# Altium footprint library 封装库.PcbLib: 755 footprints (part 40 of 48)
Each footprint in its own frame and in the unit in brackets; x right, y up, seen from the top. Pads: shape width x height; smd on the part's side, far side on the other; paste and mask are expansions set on the pad; w line width, h text height; cw(c..) or ccw(c..) is an arc to the next point about the centre after c.
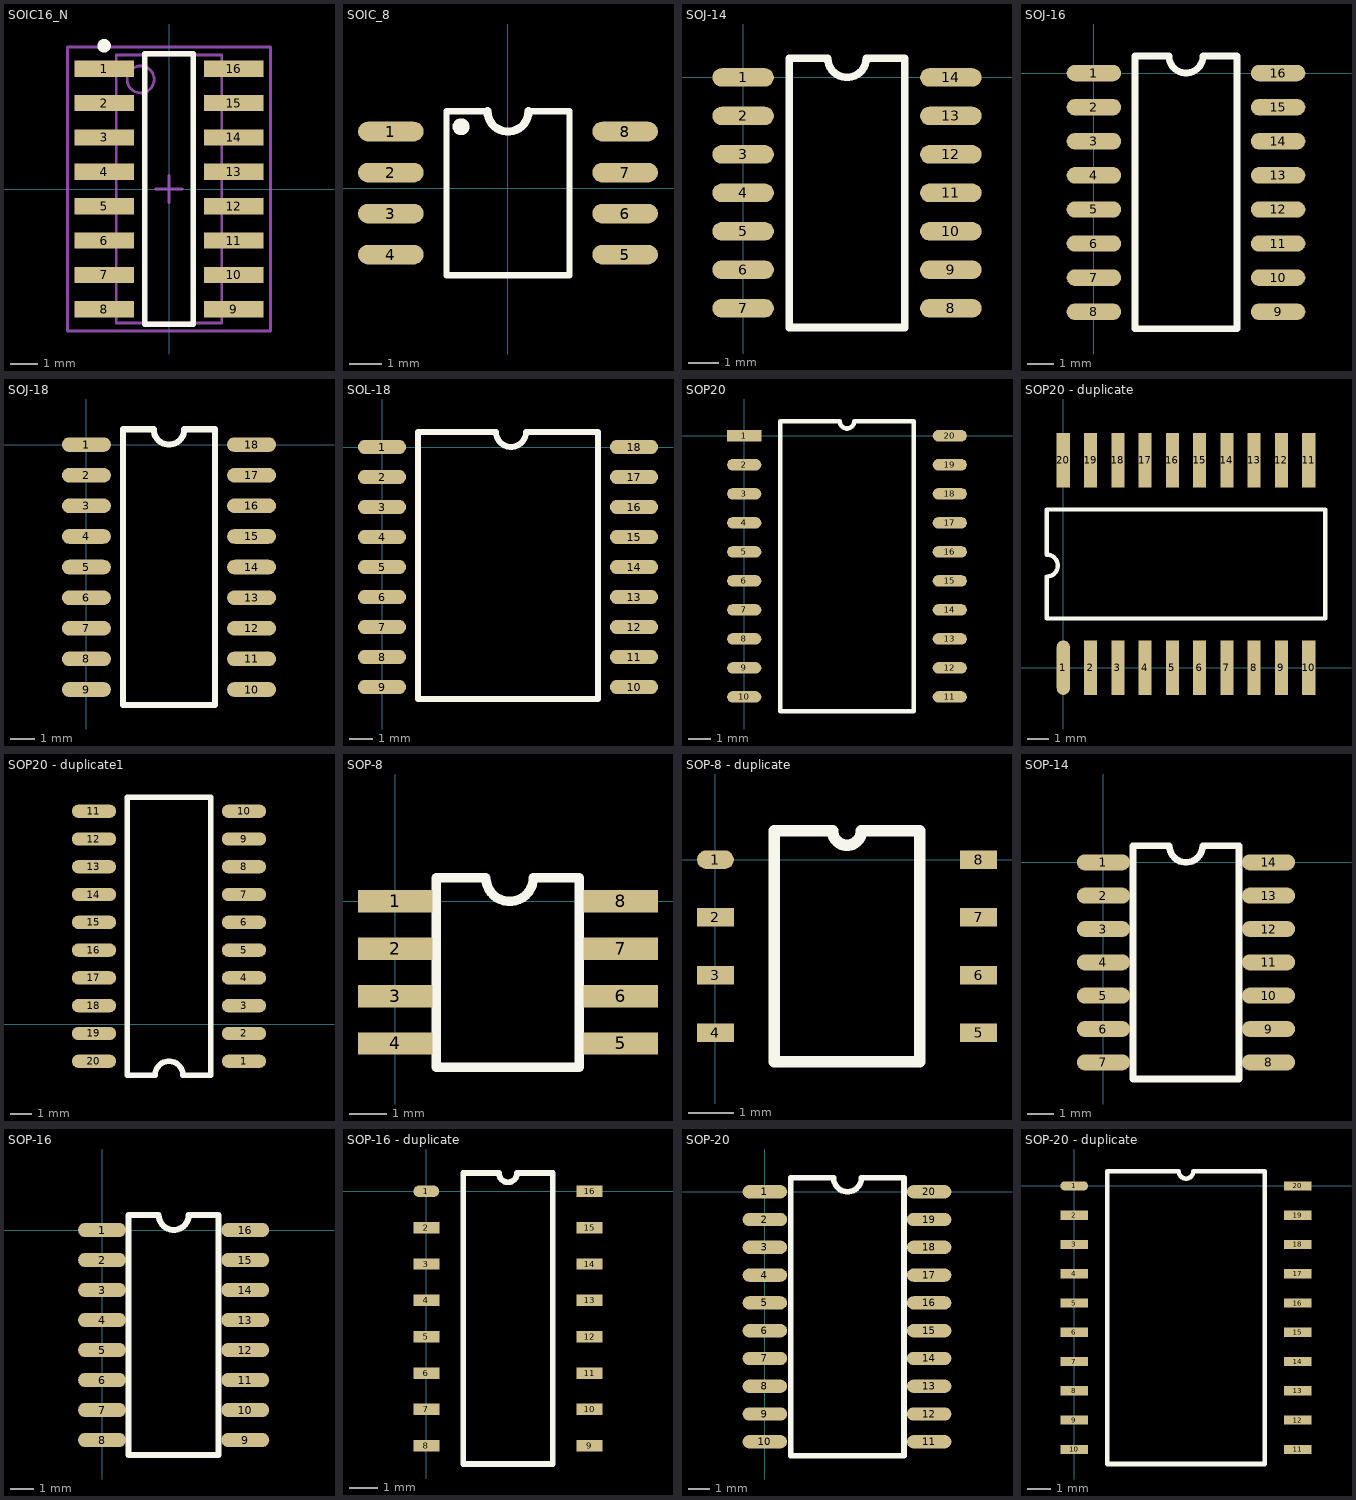
[diagram p39: the footprints below, top view; thin cyan lines are the x and y axes]

## SOIC16_N [mm] "SOIC, 16-Leads, Body 9.9x3.9mm, Pitch 1.27mm, IPC Medium Density"
height 1.91
pads (16):
  rect 2.2x0.6 smd: 1(-2.4,4.445) 2(-2.4,3.175) 3(-2.4,1.905) 4(-2.4,0.635) 5(-2.4,-0.635) 6(-2.4,-1.905) 7(-2.4,-3.175) 8(-2.4,-4.445) 9(2.4,-4.445) 10(2.4,-3.175) 11(2.4,-1.905) 12(2.4,-0.635) 13(2.4,0.635) 14(2.4,1.905) 15(2.4,3.175) 16(2.4,4.445)
Top Overlay:
  circle w0.25: c-2.4,5.295 r0.125
  lines w0.2: -0.9,-5 0.9,-5 0.9,5 -0.9,5 -0.9,-5
Mechanical 13:
  circle w0.1: c-1.05,4.05 r0.5
  lines w0.1: -1.95,-4.95 1.95,-4.95 1.95,4.95 -1.95,4.95 -1.95,-4.95
Mechanical 15:
  lines w0.1: -0.5,0 0.5,0 ; 0,-0.5 0,0.5 ; -3.75,-5.25 3.75,-5.25 3.75,5.25 -3.75,5.25 -3.75,-5.25
3D body: height 1.91, standoff 0, extent -1.95,-4.95 1.95,4.95

## SOIC_8 [mil] "DS1302"
pads (8):
  oval 80x24 smd: 1(-142.75,69) 2(-142.75,19) 3(-142.75,-31) 4(-142.75,-81) 5(143,-81) 6(143,-31) 7(143,19) 8(143,69)
Top Overlay:
  circle w10: c-57.12,74.91 r5.3
  lines w7.87: -24.87,94 -74.87,94 -74.87,-106 75.13,-106 75.13,94 25.13,94
  lines w10: -24.87,94 ccw(c0.13,94) 25.13,94

## SOJ-14 [mil]
pads (14):
  oval 80x24 smd: 1(0,0) 2(0,-50) 3(0,-100) 4(0,-150) 5(0,-200) 6(0,-250) 7(0,-300) 8(270,-300) 9(270,-250) 10(270,-200) 11(270,-150) 12(270,-100) 13(270,-50) 14(270,0)
Top Overlay:
  lines w10: 60,-325 210,-325 210,25 160,25 cw(c135,25) 110,25 60,25 60,-325

## SOJ-16 [mil]
pads (16):
  oval 80x24 smd: 1(0,0) 2(0,-50) 3(0,-100) 4(0,-150) 5(0,-200) 6(0,-250) 7(0,-300) 8(0,-350) 9(270,-350) 10(270,-300) 11(270,-250) 12(270,-200) 13(270,-150) 14(270,-100) 15(270,-50) 16(270,0)
Top Overlay:
  lines w10: 60,-375 210,-375 210,25 160,25 cw(c135,25) 110,25 60,25 60,-375

## SOJ-18 [mil]
pads (18):
  oval 80x24 smd: 1(0,0) 2(0,-50) 3(0,-100) 4(0,-150) 5(0,-200) 6(0,-250) 7(0,-300) 8(0,-350) 9(0,-400) 10(270,-400) 11(270,-350) 12(270,-300) 13(270,-250) 14(270,-200) 15(270,-150) 16(270,-100) 17(270,-50) 18(270,0)
Top Overlay:
  lines w10: 60,-425 210,-425 210,25 160,25 cw(c135,25) 110,25 60,25 60,-425

## SOL-18 [mil]
pads (18):
  oval 80x24 smd: 1(0,0) 2(0,-50) 3(0,-100) 4(0,-150) 5(0,-200) 6(0,-250) 7(0,-300) 8(0,-350) 9(0,-400) 10(420,-400) 11(420,-350) 12(420,-300) 13(420,-250) 14(420,-200) 15(420,-150) 16(420,-100) 17(420,-50) 18(420,0)
Top Overlay:
  lines w10: 60,-420 360,-420 360,25 240,25 cw(c215,25) 190,25 60,25 60,-420

## SOP20 [mm]
pads (20):
  rect 1.5x0.5 smd: 1(0,0)
  oval 1.5x0.5 smd: 2(0,-1.27) 3(0,-2.54) 4(0,-3.81) 5(0,-5.08) 6(0,-6.35) 7(0,-7.62) 8(0,-8.89) 9(0,-10.16) 10(0,-11.43) 11(9,-11.43) 12(9,-10.16) 13(9,-8.89) 14(9,-7.62) 15(9,-6.35) 16(9,-5.08) 17(9,-3.81) 18(9,-2.54) 19(9,-1.27) 20(9,0)
Top Overlay:
  lines w0.2: 1.585,-12.065 1.585,0.635 4.183,0.635 ccw(c4.5,0.635) 4.817,0.635 7.415,0.635 7.415,-12.065 1.585,-12.065

## SOP20 - duplicate [mil]
pads (20):
  oval 24x100 smd: 1(0,0)
  rect 24x100 smd: 2(50,0) 3(100,0) 4(150,0) 5(200,0) 6(250,0) 7(300,0) 8(350,0) 9(400,0) 10(450,0) 11(450,380) 12(400,380) 13(350,380) 14(300,380) 15(250,380) 16(200,380) 17(150,380) 18(100,380) 19(50,380) 20(0,380)
Top Overlay:
  lines w8: -30,90 -30,167 ccw(c-30,187) -30,207 -30,290 480,290 480,90 -30,90

## SOP20 - duplicate1 [mil]
height 509.06
pads (20):
  oval 80x24 smd: 1(527.41,-66.22) 2(527.41,-16.22) 3(527.41,33.78) 4(527.41,83.78) 5(527.41,133.78) 6(527.41,183.78) 7(527.41,233.78) 8(527.41,283.78) 9(527.41,333.78) 10(527.41,383.78) 11(257.41,383.78) 12(257.41,333.78) 13(257.41,283.78) 14(257.41,233.78) 15(257.41,183.78) 16(257.41,133.78) 17(257.41,83.78) 18(257.41,33.78) 19(257.41,-16.22) 20(257.41,-66.22)
Top Overlay:
  lines w10: 317.41,-91.22 317.41,408.78 467.41,408.78 467.41,-91.22 417.41,-91.22 ccw(c392.41,-91.22) 367.41,-91.22 317.41,-91.22

## SOP-8 [mm]
pads (8):
  rect 2x0.6 smd: 1(0,0) 2(0,-1.27) 3(0,-2.54) 4(0,-3.81) 5(6.048,-3.81) 6(6.048,-2.54) 7(6.048,-1.27) 8(6.048,0)
Top Overlay:
  lines w0.254: 1.098,-4.445 4.938,-4.445 4.938,0.635 3.703,0.635 cw(c3.068,0.635) 2.433,0.635 1.098,0.635 1.098,-4.445

## SOP-8 - duplicate [mil] "stc"
pads (8):
  oval 32x16 smd: 1(0,0)
  rect 32x16 smd: 2(0,-50) 3(0,-100) 4(0,-150) 5(228,-150) 6(228,-100) 7(228,-50) 8(228,0)
Top Overlay:
  lines w10: 51,-175 177,-175 177,25 126.5,25 cw(c114,25) 101.5,25 51,25 51,-175

## SOP-14 [mil]
pads (14):
  oval 80x24 smd: 1(0,0) 2(0,-50) 3(0,-100) 4(0,-150) 5(0,-200) 6(0,-250) 7(0,-300) 8(247.56,-300) 9(247.56,-250) 10(247.56,-200) 11(247.56,-150) 12(247.56,-100) 13(247.56,-50) 14(247.56,0)
Top Overlay:
  lines w10: 44.25,-325 203.31,-325 203.31,25 148.78,25 cw(c123.78,25) 98.78,25 44.25,25 44.25,-325

## SOP-16 [mil]
pads (16):
  oval 80x24 smd: 1(0,0) 2(0,-50) 3(0,-100) 4(0,-150) 5(0,-200) 6(0,-250) 7(0,-300) 8(0,-350) 9(238.5,-350) 10(238.5,-300) 11(238.5,-250) 12(238.5,-200) 13(238.5,-150) 14(238.5,-100) 15(238.5,-50) 16(238.5,0)
Top Overlay:
  lines w10: 44.25,-375 194.25,-375 194.25,25 144.25,25 cw(c119.25,25) 94.25,25 44.25,25 44.25,-375

## SOP-16 - duplicate [mm] "stc"
pads (16):
  oval 0.9x0.4 smd: 1(0,0)
  rect 0.9x0.4 smd: 2(0,-1.27) 3(0,-2.54) 4(0,-3.81) 5(0,-5.08) 6(0,-6.35) 7(0,-7.62) 8(0,-8.89) 9(5.7,-8.89) 10(5.7,-7.62) 11(5.7,-6.35) 12(5.7,-5.08) 13(5.7,-3.81) 14(5.7,-2.54) 15(5.7,-1.27) 16(5.7,0)
Top Overlay:
  lines w0.2: 1.285,-9.525 1.285,0.635 2.532,0.635 ccw(c2.85,0.635) 3.167,0.635 4.415,0.635 4.415,-9.525 1.285,-9.525

## SOP-20 [mil]
pads (20):
  oval 80x24 smd: 1(0,0) 2(0,-50) 3(0,-100) 4(0,-150) 5(0,-200) 6(0,-250) 7(0,-300) 8(0,-350) 9(0,-400) 10(0,-450) 11(295.59,-450) 12(295.59,-400) 13(295.59,-350) 14(295.59,-300) 15(295.59,-250) 16(295.59,-200) 17(295.59,-150) 18(295.59,-100) 19(295.59,-50) 20(295.59,0)
Top Overlay:
  lines w10: 46.22,-475 250.35,-475 250.35,25 173.78,25 cw(c148.78,25) 123.78,25 46.22,25 46.22,-475

## SOP-20 - duplicate [mm] "stc"
pads (20):
  oval 1.2x0.4 smd: 1(0,0)
  rect 1.2x0.4 smd: 2(0,-1.27) 3(0,-2.54) 4(0,-3.81) 5(0,-5.08) 6(0,-6.35) 7(0,-7.62) 8(0,-8.89) 9(0,-10.16) 10(0,-11.43) 11(9.7,-11.43) 12(9.7,-10.16) 13(9.7,-8.89) 14(9.7,-7.62) 15(9.7,-6.35) 16(9.7,-5.08) 17(9.7,-3.81) 18(9.7,-2.54) 19(9.7,-1.27) 20(9.7,0)
Top Overlay:
  lines w0.2: 1.435,-12.065 1.435,0.635 4.533,0.635 ccw(c4.85,0.635) 5.168,0.635 8.265,0.635 8.265,-12.065 1.435,-12.065